# Altium footprint library PBL - SMD Packages.PcbLib: 263 footprints (part 1 of 17)
Each footprint in its own frame and in the unit in brackets; x right, y up, seen from the top. Pads: shape width x height; smd on the part's side, far side on the other; paste and mask are expansions set on the pad; w line width, h text height; cw(c..) or ccw(c..) is an arc to the next point about the centre after c.
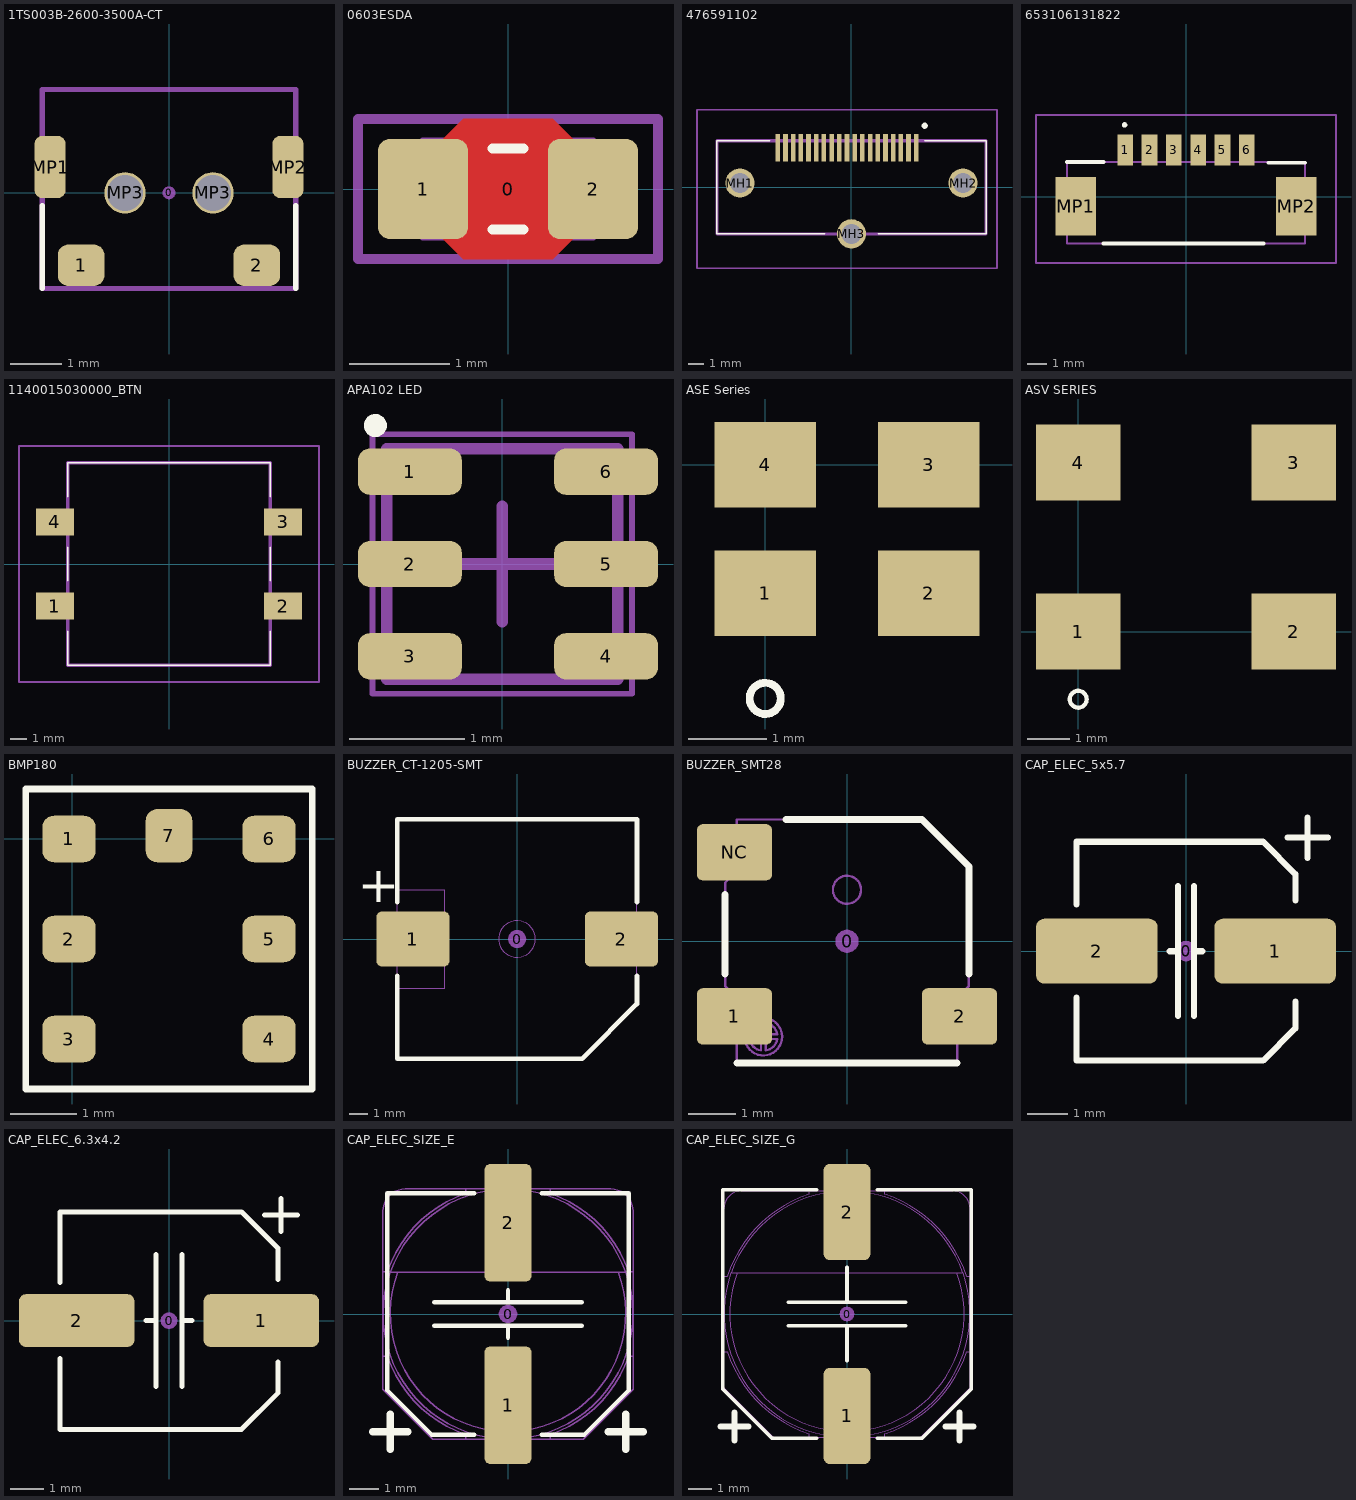
[diagram p0: the footprints below, top view; thin cyan lines are the x and y axes]

## 1TS003B-2600-3500A-CT [mm] "TACT_SW"
pads (7):
  round 0.254 on Mech15: 0(0,0)
  rrect50% 0.9x0.8 smd mask+0.05: 1(-1.7,-1.4) 2(1.7,-1.4)
  rrect50% 0.6x1.2 smd mask+0.05: MP1(-2.3,0.5) MP2(2.3,0.5)
  round 0.8 hole 0.7 mask+0.05: MP3(-0.85,0) MP3(0.85,0)
Top Overlay:
  lines w0.1: -2.45,-1.85 -2.45,-0.25 ; 2.45,-1.85 2.45,-0.25
Mechanical 3:
  lines w0.1: -2.45,-1.85 2.45,-1.85 2.45,2 -2.45,2 -2.45,-1.85
3D body "SWITCH_xiaobeibei.STEP": height 1.9, standoff -0.3, extent -2.459,-1.841 2.441,1.993

## 0603ESDA [mm] "Chip ESD suppressor, Body 1.6x0.8mm, 0603, IPC Medium Density"
height 0.8
pads (3):
  round 0.254 on Mech15: 0(0,0)
  rrect25% 0.9x1 smd: 1(-0.85,0) 2(0.85,0)
Top Layer:
  pour cut-out: -0.65,0.5 -0.45,0.7 0.45,0.7 0.65,0.5 0.65,-0.5 0.45,-0.7 -0.45,-0.7 -0.65,-0.5
Top Overlay:
  lines w0.102: -0.152,-0.406 0.152,-0.406 ; -0.152,0.406 0.152,0.406
13 - 3D Top Side:
  lines w0.076: -0.85,-0.475 -0.85,0.475 0.85,0.475 0.85,-0.475 -0.85,-0.475
15 - Top Courtyards:
  lines w0.1: -1.5,-0.7 -1.5,0.7 1.5,0.7 1.5,-0.7 -1.5,-0.7
3D body "ESD Suppressor 0603 SMD.STEP": height 0.79, standoff -0.01, extent -0.85,-0.45 0.85,0.45

## 476591102 [mm] "HDMI Connector"
pads (22):
  rect 0.3x1.8 smd: 1(4.21,2.575) 2(3.71,2.575) 3(3.21,2.575) 4(2.71,2.575) 5(2.21,2.575) 6(1.71,2.575) 7(1.21,2.575) 8(0.71,2.575) 9(0.21,2.575) 10(-0.29,2.575) 11(-0.79,2.575) 12(-1.29,2.575) 13(-1.79,2.575) 14(-2.29,2.575) 15(-2.79,2.575) 16(-3.29,2.575) 17(-3.79,2.575) 18(-4.29,2.575) 19(-4.79,2.575)
  round 1.9 hole 1.3: MH1(-7.25,0.275) MH2(7.25,0.275) MH3(0,-3.025)
Top Overlay:
  lines w0.1: -5.3,3.025 -8.75,3.025 -8.75,-3.025 -1.75,-3.025 ; 1.75,-3.025 8.75,-3.025 8.75,3.025 4.75,3.025
  lines w0.3: 4.71,4 ccw(c4.76,4) 4.81,4 ccw(c4.76,4) 4.71,4
13 - 3D Top Side:
  lines w0.2: -8.75,-3.025 8.75,-3.025 8.75,3.025 -8.75,3.025 -8.75,-3.025
15 - Top Courtyards:
  lines w0.1: -10.04,-5.275 9.46,-5.275 9.46,5.05 -10.04,5.05 -10.04,-5.275
3D body "476591102.stp": height 9.5, standoff -1.9, extent -8.75,-3.75 8.75,3.1

## 653106131822 [mm] "Molex picoblade"
pads (8):
  rect 0.81x1.6 smd: 1(-3.125,2.413) 2(-1.875,2.413) 3(-0.625,2.413) 4(0.625,2.413) 5(1.875,2.413) 6(3.125,2.413)
  rect 2.1x3 smd: MP1(-5.675,-0.487) MP2(5.675,-0.487)
Top Overlay:
  lines w0.2: -3.2,3.701 ccw(c-3.163,3.701) -3.125,3.701 ; -3.2,3.701 cw(c-3.163,3.701) -3.125,3.701 ; -3.2,3.701 ccw(c-3.163,3.701) -3.125,3.701 ; -6.125,1.787 -4.25,1.787 -6.125,1.787 ; -4.25,-2.413 4,-2.413 -4.25,-2.413 ; 4.25,1.75 6.125,1.75 4.25,1.75
13 - 3D Top Side:
  lines w0.1: -6.125,-2.413 -6.125,1.787 6.125,1.787 6.125,-2.413 -6.125,-2.413
15 - Top Courtyards:
  lines w0.1: -7.725,-3.413 -7.725,4.213 7.725,4.213 7.725,-3.413 -7.725,-3.413
3D body "653106131822 (rev1).stp": height 3.4, standoff -0.01, extent -6.125,-2.6 6.125,2.81

## 1140015030000_BTN [mm]
pads (4):
  rect 2.25x1.6 smd: 1(-6.775,-2.5) 2(6.775,-2.5) 3(6.775,2.5) 4(-6.775,2.5)
Top Overlay:
  lines w0.1: -6,-4 -6,-6 6,-6 6,-4 ; -6,-1 -6,1 ; -6,4 -6,6 6,6 6,4 ; 6,-1 6,1
13 - 3D Top Side:
  lines w0.2: -6,-6 6,-6 6,6 -6,6 -6,-6
15 - Top Courtyards:
  lines w0.1: -8.9,-7 8.9,-7 8.9,7 -8.9,7 -8.9,-7
3D body "1.14.001.503_0000.stp": height 5.15, standoff 0, extent -7.74,-6 7.74,6

## APA102 LED [mm] "RGB LED 2x2mm"
height 0.4
pads (6):
  rrect50% 0.9x0.4 smd: 1(-0.8,0.8) 2(-0.8,0) 3(-0.8,-0.8) 4(0.9,-0.8) 5(0.9,0) 6(0.9,0.8)
Top Overlay:
  circle w0.1: c-1.1,1.2 r0.05
Top Assembly:
  lines w0.1: -1,-1 -1,1 1,1 1,-1 -1,-1
Top Courtyard:
  lines w0.05: -1.125,-1.125 -1.125,1.125 1.125,1.125 1.125,-1.125 -1.125,-1.125
  lines w0.1: -0.5,0 0.5,0 ; 0,-0.5 0,0.5
3D body "apa102-2020.x_t": height 0.9, standoff 0, extent -1,-1 1,1

## ASE Series [mm] "Footprint used for ASE SERIES standard clock oscillator"
pads (4):
  rect 1.3x1.1 smd: 1(0,-1.65) 2(2.1,-1.65) 3(2.1,0) 4(0,0)
Top Overlay:
  circle w0.1: c0,-3 r0.2
3D body "User Library-ASE_series _ABRACON.STEP": height 1.2, standoff 0, extent -0.6,-2.05 2.6,0.45

## ASV SERIES [mm] "Footprint used for ASV SERIES standard clock oscillator"
pads (4):
  rect 2x1.8 smd mask+0.102: 1(0,0) 2(5.1,0) 3(5.1,4) 4(0,4)
Top Overlay:
  circle w0.1: c0,-1.6 r0.2
3D body "ASV.STEP": height 1.8, standoff 0, extent -0.9,-0.44 6.1,4.64

## BMP180 [mm]
pads (7):
  rrect50% 0.8x0.7 smd: 1(-0.05,0) 2(-0.05,-1.5) 3(-0.05,-3) 4(2.95,-3) 5(2.95,-1.5) 6(2.95,0)
  rrect50% 0.7x0.8 smd: 7(1.45,0.05)
Top Overlay:
  lines w0.1: -0.7,-3.75 -0.7,0.75 1.825,0.75 3.6,0.75 3.6,-3.75 -0.7,-3.75
3D body "User Library-BMP180_F.STEP": height 0.98, standoff 0, extent -0.35,-3.4 3.25,0.4

## BTSA-L-S-6 [mm] "Push switch with latch"

## BUZZER_CT-1205-SMT [mm] "Buzzer SMD sealed 12.8 L x 12.8 W x 7.6mm H 5Vp"
height 7.6
pads (3):
  round 1 on Mech15: 0(0,0)
  rrect20% 4x3 smd: 1(-5.7,0) 2(5.7,0)
Top Overlay:
  lines w0.254: -6.55,-2 -6.55,-6.55 3.55,-6.55 6.55,-3.55 6.55,-2 ; -6.55,2 -6.55,6.55 6.55,6.55 6.55,2
  text "+" at -8.7,2 h2
13 - 3D Top Side:
  circle w0.05: c0,0 r1
  lines w0.05: -6.65,-1.15 -6.65,1.15 ; -6.55,-2.7 -3.95,-2.7 -3.95,2.7 -6.55,2.7 ; -6.55,-1.15 -7.15,-1.15 -7.15,1.15 -6.55,1.15 ; 6.55,-1.15 7.15,-1.15 7.15,1.15 6.55,1.15 ; 6.65,-1.15 6.65,1.15 ; -6.55,-6.55 3.55,-6.55 6.55,-3.55 6.55,6.55 -6.55,6.55 -6.55,-6.55
3D body "CT-1205-SMT.STEP": height 7.6, standoff 0, extent -7.15,-6.55 7.15,6.55

## BUZZER_SMT28 [mm] "Buzzer SMD sealed 5.0 L x 5.0 W x 2.0mm H 5Vp"
height 2.2
pads (4):
  round 0.5 on Mech15: 0(0,0)
  rrect20% 1.6x1.2 smd: 1(-2.4,-1.6) 2(2.4,-1.6) NC(-2.4,1.9)
Top Overlay:
  lines w0.15: -2.6,-0.7 -2.6,1 ; -2.35,-2.6 2.35,-2.6 ; -1.3,2.6 1.6,2.6 2.6,1.6 2.6,-0.7
13 - 3D Top Side:
  circle w0.05: c0,1.1 r0.3
  circle w0.05: c-1.784,-2.034 r0.4
  lines w0.05: -2.65,-1.95 -2.65,-1.25 ; -2.65,1.55 -2.65,2.25 ; -2.35,-1.95 -2.75,-1.95 -2.75,-1.25 -2.35,-1.25 ; -2.35,1.55 -2.75,1.55 -2.75,2.25 -2.35,2.25 ; 2.35,-1.95 2.75,-1.95 2.75,-1.25 2.35,-1.25 ; 2.65,-1.95 2.65,-1.25 ; -2.6,-0.95 -2.6,1.25 -2.35,1.5 -2.35,2.6 1.6,2.6 2.6,1.6 2.6,-0.95 2.35,-1.2 2.35,-2.6 -2.35,-2.6 -2.35,-1.2 -2.6,-0.95 ; -2.08,-2.084 ccw(c-1.784,-2.034) -1.834,-2.33 -1.834,-2.084 -2.08,-2.084 ; -2.08,-1.984 cw(c-1.784,-2.034) -1.834,-1.739 -1.834,-1.984 -2.08,-1.984 ; -1.734,-2.33 ccw(c-1.784,-2.034) -1.489,-2.084 -1.734,-2.084 -1.734,-2.33 ; -1.734,-1.984 -1.489,-1.984 ccw(c-1.784,-2.034) -1.734,-1.739 -1.734,-1.984
3D body "Buzzer SMT28 series.STEP": height 2, standoff 0, extent -2.75,-2.6 2.75,2.6

## CAP_ELEC_5x5.7 [mm] "Capacitor, polarized, aluminum can; 5x5.7mm DxH"
height 5.7
pads (3):
  round 0.508 on Mech15: 0(0,0)
  rrect25% 3x1.6 smd: 1(2.2,0) 2(-2.2,0)
Top Overlay:
  lines w0.152: -2.7,-1.15 -2.7,-2.7 1.9,-2.7 2.7,-1.9 2.7,-1.25 ; -2.7,1.15 -2.7,2.7 1.9,2.7 2.7,1.9 2.7,1.25 ; -0.4,0 -0.2,0 ; -0.2,-1.6 -0.2,1.6 ; 0.2,-1.6 0.2,1.6 ; 0.2,0 0.4,0 ; 2.5,2.8 3,2.8 3.5,2.8 ; 3,2.3 3,3.3
3D body "Cap, elec, 5x5.7_.STEP": height 5.7, standoff 0, extent -2.65,-2.65 2.65,2.65

## CAP_ELEC_6.3x4.2 [mm] "Capacitor, polarized, aluminum can; 6.3x4.2mm DxH"
height 4.2
pads (3):
  round 0.508 on Mech15: 0(0,0)
  rrect25% 3.5x1.6 smd: 1(2.8,0) 2(-2.8,0)
Top Overlay:
  lines w0.152: -3.3,-1.15 -3.3,-3.3 2.2,-3.3 3.3,-2.2 3.3,-1.25 ; -3.3,1.15 -3.3,3.3 2.2,3.3 3.3,2.2 3.3,1.25 ; -0.7,0 -0.5,0 ; -0.4,-2 -0.4,2 ; 0.4,-2 0.4,2 ; 0.5,0 0.7,0 ; 2.9,3.2 3.4,3.2 3.9,3.2 ; 3.4,2.7 3.4,3.7
3D body "Cap, elec, 6.3x4.2.STEP": height 4.23, standoff 0, extent -3.3,-3.3 3.3,3.3

## CAP_ELEC_SIZE_E [mm] "Capacitor, polarized, aluminum can; 8.0x6.2mm DxH"
height 6.2
pads (3):
  round 0.635 on Mech15: 0(0,0)
  rrect25% 1.6x4 smd: 1(0,-3.1) 2(0,3.1)
Top Overlay:
  lines w0.152: -2.5,-0.4 2.5,-0.4 ; -2.5,0.4 2.5,0.4 ; -1.15,-4.1 -2.6,-4.1 -4.1,-2.6 -4.1,4.1 -1.15,4.1 ; 0,-0.8 0,-0.4 ; 0,0.4 0,0.8 ; 1.15,-4.1 2.6,-4.1 4.1,-2.6 4.1,4.1 1.15,4.1
  lines w0.254: -4.6,-4 -3.4,-4 ; -4,-4.6 -4,-3.4 ; 3.4,-4 4.6,-4 ; 4,-4.6 4,-3.4
13 - 3D Top Side:
  lines w0.05: -4.25,-1.436 -4.106,-1.436 ccw(c0,0) -1.436,-4.106 -1.436,-4.25 ; -4.25,1.436 -4.106,1.436 cw(c0,0) -1.436,4.106 -1.436,4.25 ; -4.005,1.417 cw(c0,0) 4.005,1.417 ; -3.741,1.417 ccw(c0,0) 3.741,1.417 ; -0.325,-4.25 -0.325,-4.75 0.325,-4.75 0.325,-4.25 ; -0.325,4.25 -0.325,4.75 0.325,4.75 0.325,4.25 ; 1.436,-4.25 1.436,-4.106 ccw(c0,0) 4.106,-1.436 4.25,-1.436 ; 1.436,4.25 1.436,4.106 cw(c0,0) 4.106,1.436 4.25,1.436 ; -4.25,-2.55 -2.55,-4.25 2.55,-4.25 4.25,-2.55 4.25,3.5 ccw(c3.5,3.5) 3.5,4.25 -3.5,4.25 ccw(c-3.5,3.5) -4.25,3.5 -4.25,-2.55 ; -4.007,1.417 ccw(c0,0) 4.007,1.417 -4.007,1.417
3D body "CAP Alum Elec Size E.STEP": height 6.5, standoff 0, extent -4.25,-4.75 4.25,4.75

## CAP_ELEC_SIZE_G [mm] "Capacitor, polarized, aluminum can; 10.0x10.2mm DxH"
height 10.2
pads (3):
  round 0.635 on Mech15: 0(0,0)
  rrect25% 2x4.1 smd: 1(0,-4.35) 2(0,4.35)
Top Overlay:
  lines w0.152: -2.5,-0.5 2.5,-0.5 ; -2.5,0.5 2.5,0.5 ; -1.3,-5.3 -3.2,-5.3 -5.3,-3.2 -5.3,5.3 -1.3,5.3 ; 0,-2 0,-0.5 ; 0,0.5 0,2 ; 1.3,-5.3 3.2,-5.3 5.3,-3.2 5.3,5.3 1.3,5.3
  lines w0.254: -5.4,-4.8 -4.2,-4.8 ; -4.8,-5.4 -4.8,-4.2 ; 4.2,-4.8 5.4,-4.8 ; 4.8,-5.4 4.8,-4.2
13 - 3D Top Side:
  lines w0.05: -5.25,-1.601 -5.105,-1.601 ccw(c0,0) -1.601,-5.105 -1.601,-5.25 ; -5.25,1.601 -5.105,1.601 cw(c0,0) -1.601,5.105 -1.601,5.25 ; -4.948,1.75 cw(c0,0) 4.948,1.75 ; -4.684,1.75 ccw(c0,0) 4.684,1.75 ; -0.45,-5.25 -0.45,-6 0.45,-6 0.45,-5.25 ; -0.45,5.25 -0.45,6 0.45,6 0.45,5.25 ; 1.601,-5.25 1.601,-5.105 ccw(c0,0) 5.105,-1.601 5.25,-1.601 ; 1.601,5.25 1.601,5.105 cw(c0,0) 5.105,1.601 5.25,1.601 ; -5.25,-3.15 -3.15,-5.25 3.15,-5.25 5.25,-3.15 5.25,4.5 ccw(c4.5,4.5) 4.5,5.25 -4.5,5.25 ccw(c-4.5,4.5) -5.25,4.5 -5.25,-3.15 ; -4.95,1.75 ccw(c0,0) 4.95,1.75 -4.95,1.75
3D body "CAP Alum Elec Size G.STEP": height 10.5, standoff 0, extent -5.25,-6 5.25,6